# Altium schematic symbol library IC_ADI.SCHLIB: 3169 symbols (part 124 of 181)
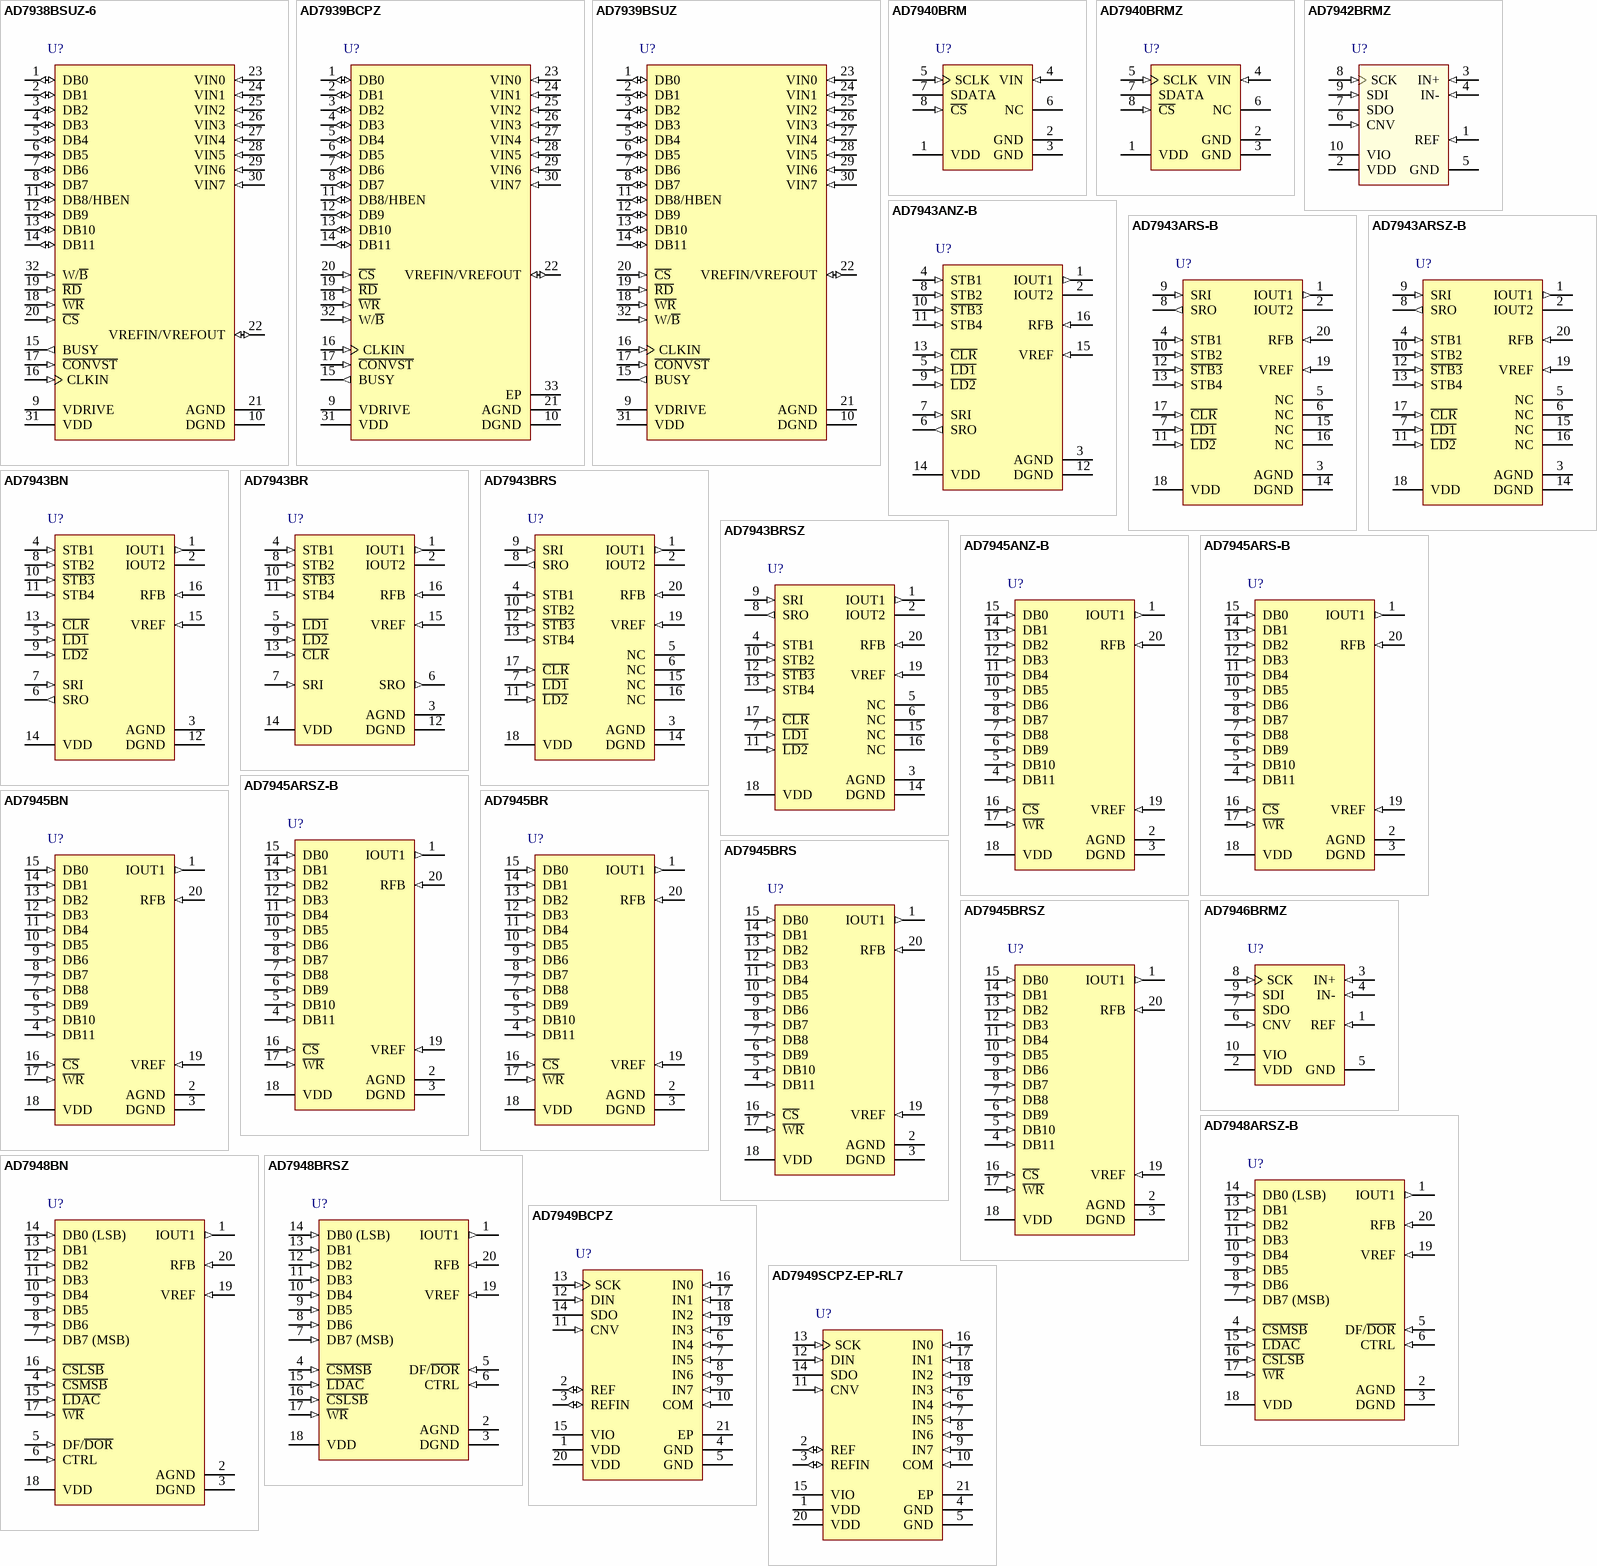
[diagram p314: symbols AD7938BSUZ-6 to AD7949SCPZ-EP-RL7]

## AD7940BRM
designator U?
Single 14-Bit Analog-to-Digital Converter with Serial, SPI Interface, 100KSPS, -40 to +85 degC, RM-8, Tube; Generic Part Number: AD7940; PartNumber: AD7940BRM; Resolution (Bits): 14; Channels: 1; Throughput Rate (SPS): 100K; Interface: Ser, SPI; DatasheetVersion: Rev.A; PackageVersion: Aug-2005; PackageReference: RM-8; PackageDescription: 8-Lead Mini Small Outline Package [MSOP]; Supplier Part Number 1: AD7940BRM-ND; Supplier Part Number 2: 8397783; Supplier Part Number 3: 31M4413; Supplier Part Number 4: 584-AD7940BRM; RoHS: N; Packing: Tube; Mounting Technology: Surface Mount; Code_JEDEC: MO-187-AA; ComponentLink1Description: Manufacturer URL; ComponentLink2Description: Datasheet; ComponentLink3Description: Package Specification; ComponentLink4Description: Product URL
footprint VSSOP8_0.65 (Footprint not found)
pins: 1 VDD (power) "Power Supply Input. The VDD range for the AD7940 is from 2.5 V to 5.5 V.", 2 GND (power) "Analog Ground. Ground reference point for all circuitry on the AD7940. All analog input signals should be referred to this GND voltage.", 3 GND (power) "Analog Ground. Ground reference point for all circuitry on the AD7940. All analog input signals should be referred to this GND voltage.", 4 VIN (in) "Analog Input. Single-ended analog input channel. The input range is 0 V to VDD.", 5 SCLK (in) "Serial Clock. Logic input. SCLK provides the serial clock for accessing data from this part. This clock input is also used as the clock source for the AD7940's conversion process.", 6 NC "No Connect. This pin should be left unconnected.", 7 SDATA (hiz) "Data Out. Logic output. The conversion result from the AD7940 is provided on this output as a serial data stream. The bits are clocked out on the falling edge of the SCLK input. The data stream from the AD7940 consists of (See Datasheet)", 8 ~{CS} (in) "Chip Select. Active low logic input. This input provides the dual function of initiating conversions on the AD7940 and framing the serial data transfer."

## AD7940BRMZ
designator U?
Single 14-Bit Analog-to-Digital Converter with Serial, SPI Interface, 100KSPS, -40 to +85 degC, RM-8, Pb-Free, Tube; Generic Part Number: AD7940; PartNumber: AD7940BRMZ; Resolution (Bits): 14; Channels: 1; Throughput Rate (SPS): 100K; Interface: Ser, SPI; DatasheetVersion: Rev.A; PackageVersion: Aug-2005; PackageReference: RM-8; PackageDescription: 8-Lead Mini Small Outline Package [MSOP]; Supplier Part Number 1: AD7940BRMZ-ND; Supplier Part Number 2: 74R5997; Supplier Part Number 3: 584-AD7940BRMZ; RoHS: Y; Packing: Tube; Mounting Technology: Surface Mount; Code_JEDEC: MO-187-AA; ComponentLink1Description: Manufacturer URL; ComponentLink2Description: Datasheet; ComponentLink3Description: Package Specification; ComponentLink4Description: Product URL
footprint VSSOP8_0.65 (Footprint not found)
pins: 1 VDD (power) "Power Supply Input. The VDD range for the AD7940 is from 2.5 V to 5.5 V.", 2 GND (power) "Analog Ground. Ground reference point for all circuitry on the AD7940. All analog input signals should be referred to this GND voltage.", 3 GND (power) "Analog Ground. Ground reference point for all circuitry on the AD7940. All analog input signals should be referred to this GND voltage.", 4 VIN (in) "Analog Input. Single-ended analog input channel. The input range is 0 V to VDD.", 5 SCLK (in) "Serial Clock. Logic input. SCLK provides the serial clock for accessing data from this part. This clock input is also used as the clock source for the AD7940's conversion process.", 6 NC "No Connect. This pin should be left unconnected.", 7 SDATA (hiz) "Data Out. Logic output. The conversion result from the AD7940 is provided on this output as a serial data stream. The bits are clocked out on the falling edge of the SCLK input. The data stream from the AD7940 consists of (See Datasheet)", 8 ~{CS} (in) "Chip Select. Active low logic input. This input provides the dual function of initiating conversions on the AD7940 and framing the serial data transfer."

## AD7942BRMZ
designator U?
Single 14-Bit PulSAR Analog-to-Digital Converter with Serial, SPI Interface, 250KSPS, -40 to +85 degC, RM-10, Pb-Free, Tube; Generic Part Number: AD7942; PartNumber: AD7942BRMZ; Resolution (Bits): 14; Channels: 1; Throughput Rate (SPS): 250K; Interface: Ser, SPI; DatasheetVersion: Rev.B; PackageVersion: May-2005; PackageReference: RM-10; PackageDescription: 10-Lead Mini Small Outline Package [MSOP]; Supplier Part Number 1: AD7942BRMZ-ND; Supplier Part Number 2: 1117894; Supplier Part Number 3: 31M4414; Supplier Part Number 4: 12M9011; Supplier Part Number 5: 584-AD7942BRMZ; RoHS: Y; Packing: Tube; Mounting Technology: Surface Mount; ComponentLink1Description: Manufacturer URL; ComponentLink2Description: Datasheet; ComponentLink3Description: Package Specification; ComponentLink4Description: Product URL
footprint VSSOP10_0.5 (Footprint not found)
pins: 1 REF (in) "Reference Input Voltage. The VREF range is from 0.5 V to VDD. REF is referred to the GND pin. Decouple REF as closely as possible to a 10 uF capacitor.", 2 VDD (power) "Power Supply.", 3 IN+ (in) "Analog Input. IN+ is referred to IN-. The voltage range, that is, the difference between IN+ and IN-, is 0 V  to VREF.", 4 IN- (in) "Analog Input Ground Sense. Connect IN- to the analog ground plane or to a remote sense ground.", 5 GND (power) "Power Supply Ground.", 6 CNV (in) "Convert Input. This input pin has multiple functions. On its leading edge, CNV initiates the conversions and selects the interface mode of the part: chain mode or C\S\ mode. In C\S\ mode, CNV enables the SDO pin when low. In (See Datasheet)", 7 SDO (hiz) "Serial Data Output. The conversion result is output on this pin. It is synchronized to SCK.", 8 SCK (in) "Serial Data Clock Input. When the part is selected, the conversion result is shifted out by this clock.", 9 SDI (in) "Serial Data Input. This input provides multiple features. It selects the interface mode of the ADC as follows: Chain mode is selected if SDI is low during the CNV rising edge. In this mode, SDI is used as a data input to (See Datasheet)", 10 VIO (power) "Input/Output Interface Digital Power. Nominally at the same supply as the host interface (1.8 V, 2.5 V, 3 V, or 5 V)."

## AD7943ANZ-B
designator U?
Single 12-Bit Multiplying Digital-to-Analog Converter, 3.3 V / 5 V, -40 to +85 degC, N-16, Pb-Free, Tube; Generic Part Number: AD7943; PartNumber: AD7943ANZ-B; # DAC Outputs: 1; Max V+: 5.5V; Op Pwr Diss: 25礧; Resolution (Bits): 12; Settling Time: 600ns; Single Supply: Yes; DatasheetVersion: Rev.B; PackageVersion: 070706-A; PackageReference: N-16; PackageDescription: 16-Lead Plastic Dual In-Line Package [PDIP] Narrow Body; Supplier Part Number 1: AD7943ANZ-B-ND; Supplier Part Number 2: 584-AD7943ANZ-B; Packing: Tube; RoHS: Y; Mounting Technology: Through Hole; Code_JEDEC: MS-001; ComponentLink1Description: Manufacturer URL; ComponentLink2Description: Datasheet; ComponentLink3Description: Package Specification; ComponentLink4Description: Product URL
footprint DIP16 (Footprint not found)
pins: 1 IOUT1 (out) "DAC current output terminal 1.", 2 IOUT2 "DAC current output terminal 2. This should be connected to the AGND pin.", 3 AGND (power) "This pin connects to the back gates of the current steering switches. In normal operation, it should be connected to the signal ground of the system. In biased single-supply operation it may be biased to some voltage between (See Datasheet)", 4 STB1 (in) "This is the Strobe 1 input. Data is clocked into the input shift register on the rising edge of this signal. S\T\B\3\ must be high. STB2, STB4 must be low.", 5 ~{LD1} (in) "Active low inputs. When both of these are low, the DAC register is updated and the output will change to reflect this.", 6 SRO (out), 7 SRI (in) "Serial Data Input. Data on this line will be clocked into the input shift register on one of the Strobe inputs, when they are enabled.", 8 STB2 (in) "This is the Strobe 2 input. Data is clocked into the input shift register on the rising edge of this signal. S\T\B\3\ must be high. STB1, STB4 must be low.", 9 ~{LD2} (in) "Active low inputs. When both of these are low, the DAC register is updated and the output will change to reflect this.", 10 ~{STB3} (in) "This is the Strobe 3 input. Data is clocked into the input shift register on the falling edge of this signal. STB1, STB2, STB4, must be low.", 11 STB4 (in) "This is the Strobe 4 input. Data is clocked into the input shift register on the rising edge of this signal. S\T\B\3\ must be high. STB1, STB2 must be low.", 12 DGND (power) "Digital Ground.", 13 ~{CLR} (in) "Asynchronous C\L\R\ input. When this input is taken low, all 0s are loaded to the DAC latch.", 14 VDD (power) "Power supply input. This is nominally +5 V for Normal Mode Operation and +3.3 V to +5 V for Biased Mode Operation.", 15 VREF (in) "DAC reference input.", 16 RFB (in) "DAC feedback resistor pin."

## AD7943ARS-B
designator U?
Single 12-Bit Multiplying Digital-to-Analog Converter, 3.3 V / 5 V, -40 to +85 degC, RS-20, Tube; Generic Part Number: AD7943; PartNumber: AD7943ARS-B; # DAC Outputs: 1; Max V+: 5.5V; Op Pwr Diss: 25礧; Resolution (Bits): 12; Settling Time: 600ns; Single Supply: Yes; DatasheetVersion: Rev.B; PackageVersion: Mar-2003; PackageReference: RS-20; PackageDescription: 20-Lead Shrink Small Outline Package [SSOP]; Supplier Part Number 1: AD7943ARS-B-ND; Supplier Part Number 2: 584-AD7943ARS-B; Packing: Tube; RoHS: N; Mounting Technology: Surface Mount; Code_JEDEC: MO-150AE; ComponentLink1Description: Manufacturer URL; ComponentLink2Description: Datasheet; ComponentLink3Description: Package Specification; ComponentLink4Description: Product URL
footprint SSOP20_0.65 (Footprint not found)
pins: 1 IOUT1 (out) "DAC current output terminal 1.", 2 IOUT2 "DAC current output terminal 2. This should be connected to the AGND pin.", 3 AGND (power) "This pin connects to the back gates of the current steering switches. In normal operation, it should be connected to the signal ground of the system. In biased single-supply operation it may be biased to some voltage between (See Datasheet)", 4 STB1 (in) "This is the Strobe 1 input. Data is clocked into the input shift register on the rising edge of this signal. S\T\B\3\ must be high. STB2, STB4 must be low.", 5 NC "No connect.", 6 NC "No connect.", 7 ~{LD1} (in) "Active low input. When both of these are low, the DAC register is updated and the output will change to reflect this.", 8 SRO (out), 9 SRI (in) "Serial Data Input. Data on this line will be clocked into the input shift register on one of the Strobe inputs, when they are enabled.", 10 STB2 (in) "This is the Strobe 2 input. Data is clocked into the input shift register on the rising edge of this signal. S\T\B\3\ must be high. STB1, STB4 must be low.", 11 ~{LD2} (in) "Active low input. When both of these are low, the DAC register is updated and the output will change to reflect this.", 12 ~{STB3} (in) "This is the Strobe 3 input. Data is clocked into the input shift register on the falling edge of this signal. STB1, STB2, STB4, must be low.", 13 STB4 (in) "This is the Strobe 4 input. Data is clocked into the input shift register on the rising edge of this signal. S\T\B\3\ must be high. STB1, STB2 must be low.", 14 DGND (power) "Digital Ground.", 15 NC "No connect.", 16 NC "No connect.", 17 ~{CLR} (in) "Asynchronous C\L\R\ input. When this input is taken low, all 0s are loaded to the DAC latch.", 18 VDD (power) "Power supply input. This is nominally +5 V for Normal Mode Operation and +3.3 V to +5 V for Biased Mode Operation.", 19 VREF (in) "DAC reference input.", 20 RFB (in) "DAC feedback resistor pin."

## AD7943ARSZ-B
designator U?
Single 12-Bit Multiplying Digital-to-Analog Converter, 3.3 V / 5 V, -40 to +85 degC, RS-20, Pb-Free, Tube; Generic Part Number: AD7943; PartNumber: AD7943ARSZ-B; # DAC Outputs: 1; Max V+: 5.5V; Op Pwr Diss: 25礧; Resolution (Bits): 12; Settling Time: 600ns; Single Supply: Yes; DatasheetVersion: Rev.B; PackageVersion: Mar-2003; PackageReference: RS-20; PackageDescription: 20-Lead Shrink Small Outline Package [SSOP]; Supplier Part Number 1: AD7943ARSZ-B-ND; Supplier Part Number 2: 584-AD7943ARSZ-B; Packing: Tube; RoHS: Y; Mounting Technology: Surface Mount; Code_JEDEC: MO-150AE; ComponentLink1Description: Manufacturer URL; ComponentLink2Description: Datasheet; ComponentLink3Description: Package Specification; ComponentLink4Description: Product URL
footprint SSOP20_0.65 (Footprint not found)
pins: 1 IOUT1 (out) "DAC current output terminal 1.", 2 IOUT2 "DAC current output terminal 2. This should be connected to the AGND pin.", 3 AGND (power) "This pin connects to the back gates of the current steering switches. In normal operation, it should be connected to the signal ground of the system. In biased single-supply operation it may be biased to some voltage between (See Datasheet)", 4 STB1 (in) "This is the Strobe 1 input. Data is clocked into the input shift register on the rising edge of this signal. S\T\B\3\ must be high. STB2, STB4 must be low.", 5 NC "No connect.", 6 NC "No connect.", 7 ~{LD1} (in) "Active low input. When both of these are low, the DAC register is updated and the output will change to reflect this.", 8 SRO (out), 9 SRI (in) "Serial Data Input. Data on this line will be clocked into the input shift register on one of the Strobe inputs, when they are enabled.", 10 STB2 (in) "This is the Strobe 2 input. Data is clocked into the input shift register on the rising edge of this signal. S\T\B\3\ must be high. STB1, STB4 must be low.", 11 ~{LD2} (in) "Active low input. When both of these are low, the DAC register is updated and the output will change to reflect this.", 12 ~{STB3} (in) "This is the Strobe 3 input. Data is clocked into the input shift register on the falling edge of this signal. STB1, STB2, STB4, must be low.", 13 STB4 (in) "This is the Strobe 4 input. Data is clocked into the input shift register on the rising edge of this signal. S\T\B\3\ must be high. STB1, STB2 must be low.", 14 DGND (power) "Digital Ground.", 15 NC "No connect.", 16 NC "No connect.", 17 ~{CLR} (in) "Asynchronous C\L\R\ input. When this input is taken low, all 0s are loaded to the DAC latch.", 18 VDD (power) "Power supply input. This is nominally +5 V for Normal Mode Operation and +3.3 V to +5 V for Biased Mode Operation.", 19 VREF (in) "DAC reference input.", 20 RFB (in) "DAC feedback resistor pin."

## AD7943BN
designator U?
Single 12-Bit Multiplying Digital-to-Analog Converter, 3.3 V / 5 V, -40 to +85 degC, N-16, Tube; Generic Part Number: AD7943; PartNumber: AD7943BN; # DAC Outputs: 1; Max V+: 5.5V; Op Pwr Diss: 25礧; Resolution (Bits): 12; Settling Time: 600ns; Single Supply: Yes; DatasheetVersion: Rev.B; PackageVersion: 070706-A; PackageReference: N-16; PackageDescription: 16-Lead Plastic Dual In-Line Package [PDIP] Narrow Body; Supplier Part Number 1: AD7943BN-ND; Supplier Part Number 2: 787085; Supplier Part Number 3: 66F2920; Supplier Part Number 4: 584-AD7943BN; Packing: Tube; RoHS: N; Mounting Technology: Through Hole; Code_JEDEC: MS-001; ComponentLink1Description: Manufacturer URL; ComponentLink2Description: Datasheet; ComponentLink3Description: Package Specification; ComponentLink4Description: Product URL
footprint DIP16 (Footprint not found)
pins: 1 IOUT1 (out) "DAC current output terminal 1.", 2 IOUT2 "DAC current output terminal 2. This should be connected to the AGND pin.", 3 AGND (power) "This pin connects to the back gates of the current steering switches. In normal operation, it should be connected to the signal ground of the system. In biased single-supply operation it may be biased to some voltage between (See Datasheet)", 4 STB1 (in) "This is the Strobe 1 input. Data is clocked into the input shift register on the rising edge of this signal. S\T\B\3\ must be high. STB2, STB4 must be low.", 5 ~{LD1} (in) "Active low inputs. When both of these are low, the DAC register is updated and the output will change to reflect this.", 6 SRO (out), 7 SRI (in) "Serial Data Input. Data on this line will be clocked into the input shift register on one of the Strobe inputs, when they are enabled.", 8 STB2 (in) "This is the Strobe 2 input. Data is clocked into the input shift register on the rising edge of this signal. S\T\B\3\ must be high. STB1, STB4 must be low.", 9 ~{LD2} (in) "Active low inputs. When both of these are low, the DAC register is updated and the output will change to reflect this.", 10 ~{STB3} (in) "This is the Strobe 3 input. Data is clocked into the input shift register on the falling edge of this signal. STB1, STB2, STB4, must be low.", 11 STB4 (in) "This is the Strobe 4 input. Data is clocked into the input shift register on the rising edge of this signal. S\T\B\3\ must be high. STB1, STB2 must be low.", 12 DGND (power) "Digital Ground.", 13 ~{CLR} (in) "Asynchronous C\L\R\ input. When this input is taken low, all 0s are loaded to the DAC latch.", 14 VDD (power) "Power supply input. This is nominally +5 V for Normal Mode Operation and +3.3 V to +5 V for Biased Mode Operation.", 15 VREF (in) "DAC reference input.", 16 RFB (in) "DAC feedback resistor pin."

## AD7943BR
designator U?
Single 12-Bit Multiplying Digital-to-Analog Converter, 3.3 V / 5 V, -40 to +85 degC, RW-16, Tube; Generic Part Number: AD7943; PartNumber: AD7943BR; # DAC Outputs: 1; Max V+: 5.5V; Op Pwr Diss: 25礧; Resolution (Bits): 12; Settling Time: 600ns; Single Supply: Yes; DatasheetVersion: Rev.B; PackageVersion: 032707-B; PackageReference: RW-16; PackageDescription: 16-Lead Standard Small Outline Package [SOIC_W]; Supplier Part Number 1: AD7943BR-ND; Supplier Part Number 2: 584-AD7943BR; Packing: Tube; RoHS: N; Mounting Technology: Surface Mount; Code_JEDEC: MS-013-AA; Code_IPC: SOIC127P1030-16; ComponentLink1Description: Manufacturer URL; ComponentLink2Description: Datasheet; ComponentLink3Description: Package Specification; ComponentLink4Description: Product URL
footprint SOIC16W_1.27 (Footprint not found)
pins: 1 IOUT1 (out) "DAC current output terminal 1.", 2 IOUT2 "DAC current output terminal 2. This should be connected to the AGND pin.", 3 AGND (power) "This pin connects to the back gates of the current steering switches. In normal operation, it should be connected to the signal ground of the system. In biased single-supply operation it may be biased to some voltage between (See Datasheet)", 4 STB1 (in) "This is the Strobe 1 input. Data is clocked into the input shift register on the rising edge of this signal. S\T\B\3\ must be high. STB2, STB4 must be low.", 5 ~{LD1} (in) "Active low inputs. When both of these are low, the DAC register is updated and the output will change to reflect this.", 6 SRO (out), 7 SRI (in) "Serial Data Input. Data on this line will be clocked into the input shift register on one of the Strobe inputs, when they are enabled.", 8 STB2 (in) "This is the Strobe 2 input. Data is clocked into the input shift register on the rising edge of this signal. S\T\B\3\ must be high. STB1, STB4 must be low.", 9 ~{LD2} (in) "Active low inputs. When both of these are low, the DAC register is updated and the output will change to reflect this.", 10 ~{STB3} (in) "This is the Strobe 3 input. Data is clocked into the input shift register on the falling edge of this signal. STB1, STB2, STB4, must be low.", 11 STB4 (in) "This is the Strobe 4 input. Data is clocked into the input shift register on the rising edge of this signal. S\T\B\3\ must be high. STB1, STB2 must be low.", 12 DGND (power) "Digital Ground.", 13 ~{CLR} (in) "Asynchronous C\L\R\ input. When this input is taken low, all 0s are loaded to the DAC latch.", 14 VDD (power) "Power supply input. This is nominally +5 V for Normal Mode Operation and +3.3 V to +5 V for Biased Mode Operation.", 15 VREF (in) "DAC reference input.", 16 RFB (in) "DAC feedback resistor pin."

## AD7943BRS
designator U?
Single 12-Bit Multiplying Digital-to-Analog Converter, 3.3 V / 5 V, -40 to +85 degC, RS-20, Tube; Generic Part Number: AD7943; PartNumber: AD7943BRS; # DAC Outputs: 1; Max V+: 5.5V; Op Pwr Diss: 25礧; Resolution (Bits): 12; Settling Time: 600ns; Single Supply: Yes; DatasheetVersion: Rev.B; PackageVersion: Mar-2003; PackageReference: RS-20; PackageDescription: 20-Lead Shrink Small Outline Package [SSOP]; Supplier Part Number 1: AD7943BRS-ND; Supplier Part Number 2: 584-AD7943BRS; Packing: Tube; RoHS: N; Mounting Technology: Surface Mount; Code_JEDEC: MO-150AE; ComponentLink1Description: Manufacturer URL; ComponentLink2Description: Datasheet; ComponentLink3Description: Package Specification; ComponentLink4Description: Product URL
footprint SSOP20_0.65 (Footprint not found)
pins: 1 IOUT1 (out) "DAC current output terminal 1.", 2 IOUT2 "DAC current output terminal 2. This should be connected to the AGND pin.", 3 AGND (power) "This pin connects to the back gates of the current steering switches. In normal operation, it should be connected to the signal ground of the system. In biased single-supply operation it may be biased to some voltage between (See Datasheet)", 4 STB1 (in) "This is the Strobe 1 input. Data is clocked into the input shift register on the rising edge of this signal. S\T\B\3\ must be high. STB2, STB4 must be low.", 5 NC "No connect.", 6 NC "No connect.", 7 ~{LD1} (in) "Active low input. When both of these are low, the DAC register is updated and the output will change to reflect this.", 8 SRO (out), 9 SRI (in) "Serial Data Input. Data on this line will be clocked into the input shift register on one of the Strobe inputs, when they are enabled.", 10 STB2 (in) "This is the Strobe 2 input. Data is clocked into the input shift register on the rising edge of this signal. S\T\B\3\ must be high. STB1, STB4 must be low.", 11 ~{LD2} (in) "Active low input. When both of these are low, the DAC register is updated and the output will change to reflect this.", 12 ~{STB3} (in) "This is the Strobe 3 input. Data is clocked into the input shift register on the falling edge of this signal. STB1, STB2, STB4, must be low.", 13 STB4 (in) "This is the Strobe 4 input. Data is clocked into the input shift register on the rising edge of this signal. S\T\B\3\ must be high. STB1, STB2 must be low.", 14 DGND (power) "Digital Ground.", 15 NC "No connect.", 16 NC "No connect.", 17 ~{CLR} (in) "Asynchronous C\L\R\ input. When this input is taken low, all 0s are loaded to the DAC latch.", 18 VDD (power) "Power supply input. This is nominally +5 V for Normal Mode Operation and +3.3 V to +5 V for Biased Mode Operation.", 19 VREF (in) "DAC reference input.", 20 RFB (in) "DAC feedback resistor pin."

## AD7943BRSZ
designator U?
Single 12-Bit Multiplying Digital-to-Analog Converter, 3.3 V / 5 V, -40 to +85 degC, RS-20, Pb-Free, Tube; Generic Part Number: AD7943; PartNumber: AD7943BRSZ; # DAC Outputs: 1; Max V+: 5.5V; Op Pwr Diss: 25礧; Resolution (Bits): 12; Settling Time: 600ns; Single Supply: Yes; DatasheetVersion: Rev.B; PackageVersion: Mar-2003; PackageReference: RS-20; PackageDescription: 20-Lead Shrink Small Outline Package [SSOP]; Supplier Part Number 1: AD7943BRSZ-ND; Supplier Part Number 2: 59K6064; Supplier Part Number 3: 584-AD7943BRSZ; Packing: Tube; RoHS: Y; Mounting Technology: Surface Mount; Code_JEDEC: MO-150AE; ComponentLink1Description: Manufacturer URL; ComponentLink2Description: Datasheet; ComponentLink3Description: Package Specification; ComponentLink4Description: Product URL
footprint SSOP20_0.65 (Footprint not found)
pins: 1 IOUT1 (out) "DAC current output terminal 1.", 2 IOUT2 "DAC current output terminal 2. This should be connected to the AGND pin.", 3 AGND (power) "This pin connects to the back gates of the current steering switches. In normal operation, it should be connected to the signal ground of the system. In biased single-supply operation it may be biased to some voltage between (See Datasheet)", 4 STB1 (in) "This is the Strobe 1 input. Data is clocked into the input shift register on the rising edge of this signal. S\T\B\3\ must be high. STB2, STB4 must be low.", 5 NC "No connect.", 6 NC "No connect.", 7 ~{LD1} (in) "Active low input. When both of these are low, the DAC register is updated and the output will change to reflect this.", 8 SRO (out), 9 SRI (in) "Serial Data Input. Data on this line will be clocked into the input shift register on one of the Strobe inputs, when they are enabled.", 10 STB2 (in) "This is the Strobe 2 input. Data is clocked into the input shift register on the rising edge of this signal. S\T\B\3\ must be high. STB1, STB4 must be low.", 11 ~{LD2} (in) "Active low input. When both of these are low, the DAC register is updated and the output will change to reflect this.", 12 ~{STB3} (in) "This is the Strobe 3 input. Data is clocked into the input shift register on the falling edge of this signal. STB1, STB2, STB4, must be low.", 13 STB4 (in) "This is the Strobe 4 input. Data is clocked into the input shift register on the rising edge of this signal. S\T\B\3\ must be high. STB1, STB2 must be low.", 14 DGND (power) "Digital Ground.", 15 NC "No connect.", 16 NC "No connect.", 17 ~{CLR} (in) "Asynchronous C\L\R\ input. When this input is taken low, all 0s are loaded to the DAC latch.", 18 VDD (power) "Power supply input. This is nominally +5 V for Normal Mode Operation and +3.3 V to +5 V for Biased Mode Operation.", 19 VREF (in) "DAC reference input.", 20 RFB (in) "DAC feedback resistor pin."

## AD7945ANZ-B
designator U?
Single 12-Bit Multiplying Digital-to-Analog Converter, 3.3 V / 5 V, -40 to +85 degC, N-20, Pb-Free, Tube; Generic Part Number: AD7945; PartNumber: AD7945ANZ-B; # DAC Outputs: 1; Max V+: 5.5V; Op Pwr Diss: 25礧; Resolution (Bits): 12; Settling Time: 600ns; Single Supply: Yes; DatasheetVersion: Rev.B; PackageVersion: 070706-A; PackageReference: N-20; PackageDescription: 20-Lead Plastic Dual In-Line Package [PDIP] Narrow Body; Supplier Part Number 1: AD7945ANZ-B-ND; Supplier Part Number 2: 584-AD7945ANZ-B; Packing: Tube; RoHS: Y; Mounting Technology: Through Hole; Code_JEDEC: MS-001; ComponentLink1Description: Manufacturer URL; ComponentLink2Description: Datasheet; ComponentLink3Description: Package Specification; ComponentLink4Description: Product URL
footprint DIP20 (Footprint not found)
pins: 1 IOUT1 (out) "DAC current output terminal 1.", 2 AGND (power) "This pin connects to the back gates of the current steering switches. The DAC IOUT2 terminal is also connected internally to this point.", 3 DGND (power) "Digital Ground.", 4 DB11 (in) "Digital Data Input.", 5 DB10 (in) "Digital Data Input.", 6 DB9 (in) "Digital Data Input.", 7 DB8 (in) "Digital Data Input.", 8 DB7 (in) "Digital Data Input.", 9 DB6 (in) "Digital Data Input.", 10 DB5 (in) "Digital Data Input.", 11 DB4 (in) "Digital Data Input.", 12 DB3 (in) "Digital Data Input.", 13 DB2 (in) "Digital Data Input.", 14 DB1 (in) "Digital Data Input.", 15 DB0 (in) "Digital Data Input.", 16 ~{CS} (in) "Active Low, Chip Select Input.", 17 ~{WR} (in) "Active Low, Write Input.", 18 VDD (power) "Power supply input. This is nominally +5 V for Normal Mode Operation and +3.3 V to +5 V for Biased Mode Operation.", 19 VREF (in) "DAC reference input.", 20 RFB (in) "DAC feedback resistor pin."
